# Altium footprint library Connectors.PcbLib: 74 footprints (part 1 of 5)
Each footprint in its own frame and in the unit in brackets; x right, y up, seen from the top. Pads: shape width x height; smd on the part's side, far side on the other; paste and mask are expansions set on the pad; w line width, h text height; cw(c..) or ccw(c..) is an arc to the next point about the centre after c.
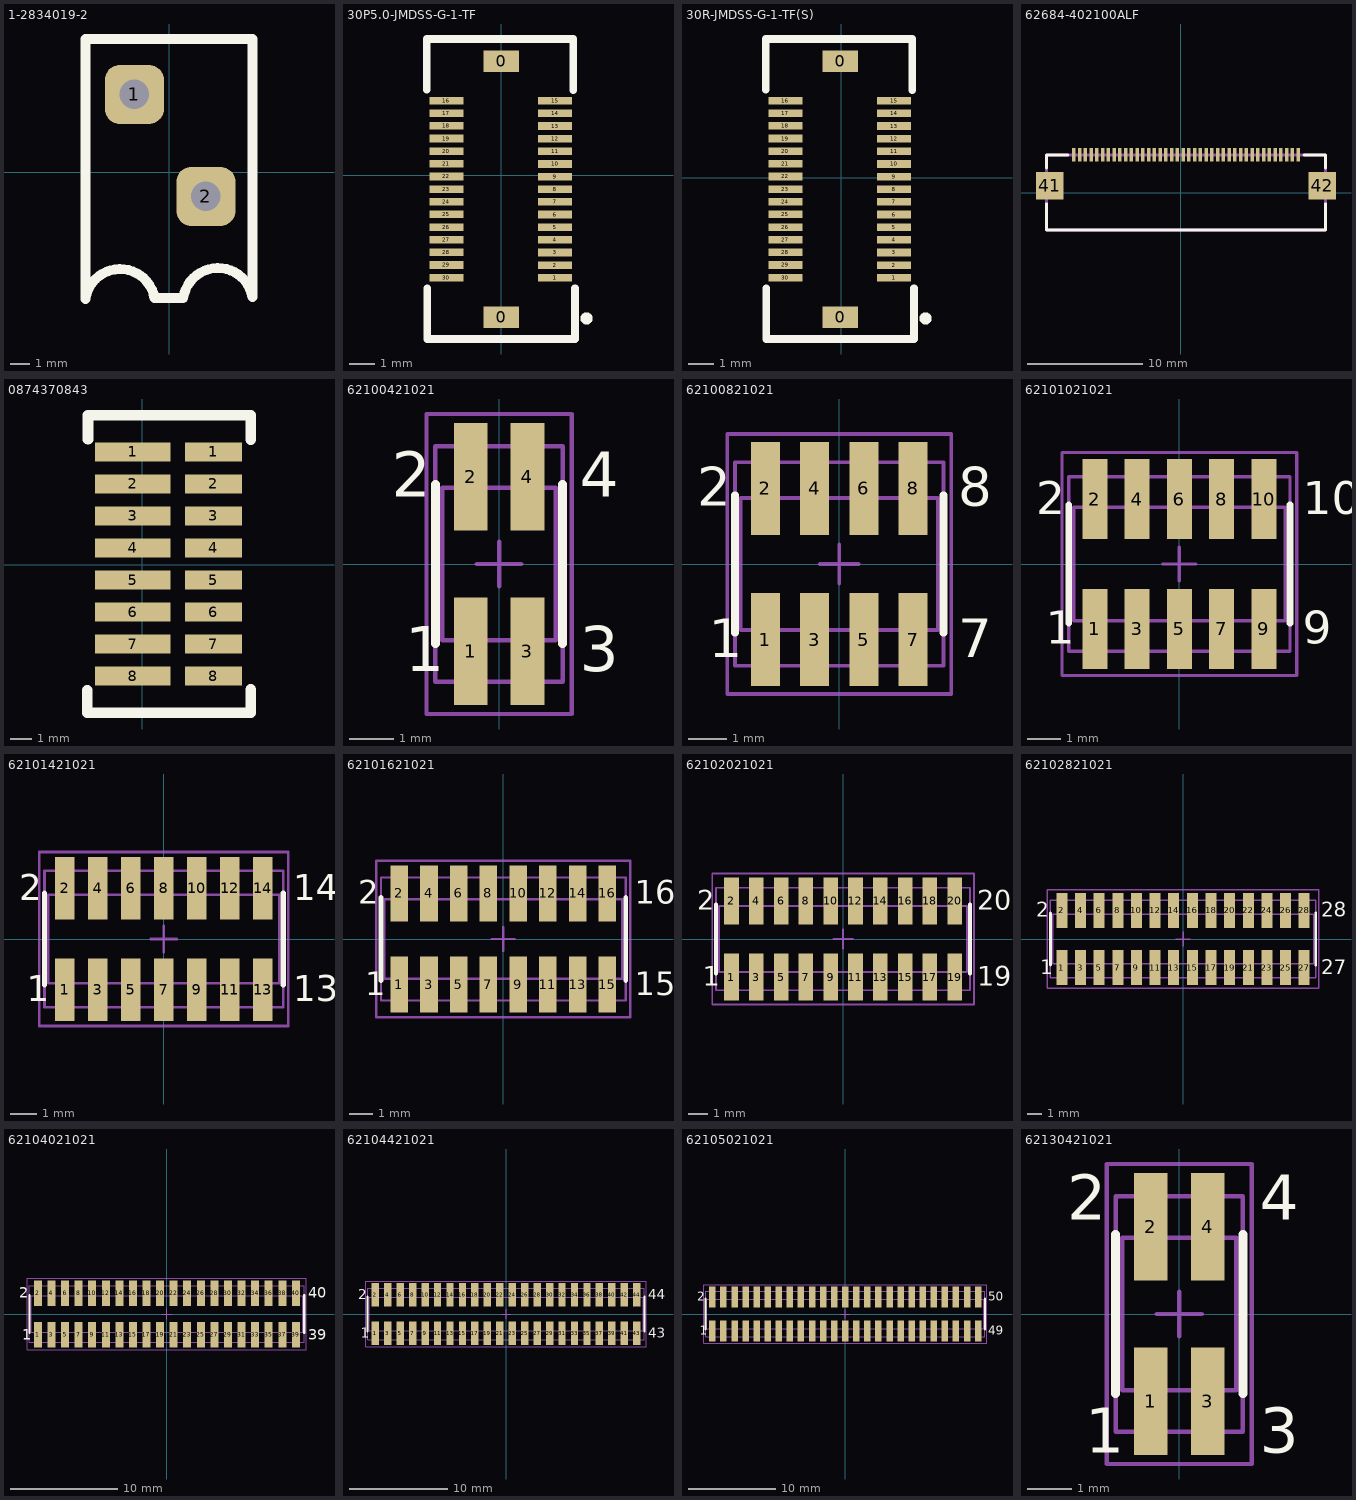
[diagram p0: the footprints below, top view; thin cyan lines are the x and y axes]

## 1-2834019-2 [mm]
pads (2):
  rrect50% 3x3 hole 1.5: 1(-1.778,3.962) 2(1.854,-1.219)
Top Overlay:
  lines w0.5: -4.267,-6.426 cw(c-2.508,-6.686) -0.757,-6.379 0.706,-6.379 ; -4.267,-6.299 -4.267,6.782 4.216,6.782 4.216,-6.299 ; 0.706,-6.372 cw(c2.465,-6.631) 4.216,-6.325
3D body "c-1-2834019-2-1-3d.stp": height 6.5, standoff -3.5, extent -3.962,-5.996 3.938,6.504

## 30P5.0-JMDSS-G-1-TF [mm]
pads (32):
  rect 1.4x0.85 smd: 0(0,-5.613) 0(0,4.496)
  rect 1.35x0.3 smd: 1(2.134,-4.056) 2(2.134,-3.556) 3(2.134,-3.056) 4(2.134,-2.556) 5(2.134,-2.056) 6(2.134,-1.556) 7(2.134,-1.056) 8(2.134,-0.556) 9(2.134,-0.056) 10(2.134,0.444) 11(2.134,0.944) 12(2.134,1.444) 13(2.134,1.944) 14(2.134,2.444) 15(2.134,2.944) 16(-2.159,2.949) 17(-2.159,2.449) 18(-2.159,1.949) 19(-2.159,1.449) 20(-2.159,0.949) 21(-2.159,0.449) 22(-2.159,-0.051) 23(-2.159,-0.551) 24(-2.159,-1.051) 25(-2.159,-1.551) 26(-2.159,-2.051) 27(-2.159,-2.551) 28(-2.159,-3.051) 29(-2.159,-3.551) 30(-2.159,-4.051)
Top Overlay:
  circle w0.254: c3.378,-5.664 r0.114
  lines w0.3: -2.946,3.378 -2.946,5.385 2.845,5.385 2.845,3.353 ; -2.921,-4.47 -2.921,-6.477 2.921,-6.477 2.921,-4.47
3D body "30P5.0-JMDSS-G-1-TF.STEP": height 3.95, standoff 0.05, extent -2.718,-6.351 2.582,5.249

## 30R-JMDSS-G-1-TF(S) [mm] "JST Connector"
pads (32):
  rect 1.4x0.85 smd: 0(-0.049,-5.509) 0(-0.049,4.6)
  rect 1.35x0.3 smd: 1(2.085,-3.952) 2(2.085,-3.452) 3(2.085,-2.952) 4(2.085,-2.452) 5(2.085,-1.952) 6(2.085,-1.452) 7(2.085,-0.952) 8(2.085,-0.452) 9(2.085,0.048) 10(2.085,0.548) 11(2.085,1.048) 12(2.085,1.548) 13(2.085,2.048) 14(2.085,2.548) 15(2.085,3.048) 16(-2.208,3.053) 17(-2.208,2.553) 18(-2.208,2.053) 19(-2.208,1.553) 20(-2.208,1.053) 21(-2.208,0.553) 22(-2.208,0.053) 23(-2.208,-0.447) 24(-2.208,-0.947) 25(-2.208,-1.447) 26(-2.208,-1.947) 27(-2.208,-2.447) 28(-2.208,-2.947) 29(-2.208,-3.447) 30(-2.208,-3.947)
Top Overlay:
  circle w0.254: c3.329,-5.56 r0.114
  lines w0.3: -2.995,3.482 -2.995,5.489 2.796,5.489 2.796,3.457 ; -2.97,-4.366 -2.97,-6.373 2.872,-6.373 2.872,-4.366
3D body "30R-JMDSS-G-1-TF(S).STEP": height 3.05, standoff -0.05, extent -2.64,-6.229 2.36,5.371

## 62684-402100ALF [mm]
pads (42):
  rect 0.3x1.2 smd: 1(-9.292,3.293) 2(-8.792,3.293) 3(-8.292,3.293) 4(-7.792,3.293) 5(-7.292,3.293) 6(-6.792,3.293) 7(-6.292,3.293) 8(-5.792,3.293) 9(-5.292,3.293) 10(-4.792,3.293) 11(-4.292,3.293) 12(-3.792,3.293) 13(-3.292,3.293) 14(-2.792,3.293) 15(-2.292,3.293) 16(-1.792,3.293) 17(-1.292,3.293) 18(-0.792,3.293) 19(-0.292,3.293) 20(0.208,3.293) 21(0.708,3.293) 22(1.208,3.293) 23(1.708,3.293) 24(2.208,3.293) 25(2.708,3.293) 26(3.208,3.293) 27(3.708,3.293) 28(4.208,3.293) 29(4.708,3.293) 30(5.208,3.293) 31(5.708,3.293) 32(6.208,3.293) 33(6.708,3.293) 34(7.208,3.293) 35(7.708,3.293) 36(8.208,3.293) 37(8.708,3.293) 38(9.208,3.293) 39(9.708,3.293) 40(10.208,3.293)
  rect 2.4x2.4 smd: 41(-11.392,0.593) 42(12.308,0.593)
Top Overlay:
  lines w0.254: -11.692,-0.964 -11.692,-3.257 12.608,-3.257 12.608,-0.964 ; -11.692,2.148 -11.692,3.293 -9.798,3.293 ; 10.714,3.293 12.608,3.293 12.608,2.148
Mechanical 15:
  lines w0.254: -11.692,-3.257 12.608,-3.257 12.608,3.293 -11.692,3.293 -11.692,-3.257
3D body "s62684-402100alf.stp": height 2, standoff -0.05, extent -12.3,-2.2 13.2,3.4

## 0874370843 [mm]
pads (16):
  rect 3.55x0.9 smd: 1(-0.457,5.289) 2(-0.457,3.789) 3(-0.457,2.289) 4(-0.457,0.789) 5(-0.457,-0.711) 6(-0.457,-2.211) 7(-0.457,-3.711) 8(-0.457,-5.211)
  rect 2.65x0.9 smd: 1(3.327,5.289) 2(3.327,3.789) 3(3.327,2.289) 4(3.327,0.789) 5(3.327,-0.711) 6(3.327,-2.211) 7(3.327,-3.711) 8(3.327,-5.211)
Top Overlay:
  lines w0.5: -2.591,-5.88 -2.591,-6.934 5.08,-6.934 5.08,-5.842 ; -2.553,5.88 -2.553,7.01 5.08,7.01 5.08,5.867
3D body "874370843.stp": height 5.77, standoff 0.02, extent -1.514,-6.599 4.486,6.701

## 62100421021 [mm] "Pin Header, pitch 1.27 mm, SMD, Vertical, dual row, 4p"
height 6.55
pads (4):
  rect 0.75x2.4 smd: 1(-0.635,-1.95) 2(-0.635,1.95) 3(0.635,-1.95) 4(0.635,1.95)
Top Overlay:
  lines w0.2: -1.42,-1.775 -1.42,1.775 ; 1.42,-1.775 1.42,1.775
  text "1" at -2.1,-2.4 h1
  text "2" at -2.4,1.5 h1
  text "3" at 1.8,-2.4 h1
  text "4" at 1.8,1.5 h1
Mechanical 11:
  lines w0.1: -1.27,-1.7 -1.27,1.7 1.27,1.7 1.27,-1.7 -1.27,-1.7
Mechanical 13:
  lines w0.1: -1.42,-2.625 1.42,-2.625 1.42,2.625 -1.42,2.625 -1.42,-2.625
Mechanical 15:
  lines w0.1: -0.5,0 0.5,0 ; 0,-0.5 0,0.5 ; -1.62,-3.35 -1.62,3.35 1.62,3.35 1.62,-3.35 -1.62,-3.35
3D body "62100421021.stp": height 5.9, standoff 0, extent -1.27,-2.55 1.27,2.55

## 62100821021 [mm] "Pin Header, pitch 1.27 mm, SMD, Vertical, dual row, 8p"
height 6.55
pads (8):
  rect 0.75x2.4 smd: 1(-1.905,-1.95) 2(-1.905,1.95) 3(-0.635,-1.95) 4(-0.635,1.95) 5(0.635,-1.95) 6(0.635,1.95) 7(1.905,-1.95) 8(1.905,1.95)
Top Overlay:
  lines w0.2: -2.69,-1.775 -2.69,1.775 ; 2.69,-1.775 2.69,1.775
  text "8" at 3.07,1.5 h1
  text "7" at 3.07,-2.4 h1
  text "2" at -3.67,1.5 h1
  text "1" at -3.37,-2.4 h1
Mechanical 11:
  lines w0.1: -2.54,-1.7 2.54,-1.7 2.54,1.7 -2.54,1.7 -2.54,-1.7
Mechanical 13:
  lines w0.1: -2.69,-2.625 -2.69,2.625 2.69,2.625 2.69,-2.625 -2.69,-2.625
Mechanical 15:
  lines w0.1: -0.5,0 0.5,0 ; 0,-0.5 0,0.5 ; -2.89,-3.35 2.89,-3.35 2.89,3.35 -2.89,3.35 -2.89,-3.35
3D body "62100821021.stp": height 5.9, standoff -0.01, extent -2.54,-2.5 2.54,2.5

## 62101021021 [mm] "Pin Header, pitch 1.27 mm, SMD, Vertical, dual row, 10p"
height 6.55
pads (10):
  rect 0.75x2.4 smd: 1(-2.54,-1.95) 2(-2.54,1.95) 3(-1.27,-1.95) 4(-1.27,1.95) 5(0,-1.95) 6(0,1.95) 7(1.27,-1.95) 8(1.27,1.95) 9(2.54,-1.95) 10(2.54,1.95)
Top Overlay:
  lines w0.2: -3.325,-1.775 -3.325,1.775 ; 3.325,-1.775 3.325,1.775
  text "10" at 3.705,1.5 h1
  text "9" at 3.705,-2.4 h1
  text "1" at -4.005,-2.4 h1
  text "2" at -4.305,1.5 h1
Mechanical 11:
  lines w0.1: -3.175,-1.7 -3.175,1.7 3.175,1.7 3.175,-1.7 -3.175,-1.7
Mechanical 13:
  lines w0.1: -3.325,-2.625 3.325,-2.625 3.325,2.625 -3.325,2.625 -3.325,-2.625
Mechanical 15:
  lines w0.1: -0.5,0 0.5,0 ; 0,-0.5 0,0.5 ; -3.525,-3.35 -3.525,3.35 3.525,3.35 3.525,-3.35 -3.525,-3.35
3D body "62101021021.stp": height 5.9, standoff -0.01, extent -3.175,-2.5 3.175,2.5

## 62101421021 [mm] "Pin Header, pitch 1.27 mm, SMD, Vertical, dual row, 14p"
height 6.55
pads (14):
  rect 0.75x2.4 smd: 1(-3.81,-1.95) 2(-3.81,1.95) 3(-2.54,-1.95) 4(-2.54,1.95) 5(-1.27,-1.95) 6(-1.27,1.95) 7(0,-1.95) 8(0,1.95) 9(1.27,-1.95) 10(1.27,1.95) 11(2.54,-1.95) 12(2.54,1.95) 13(3.81,-1.95) 14(3.81,1.95)
Top Overlay:
  lines w0.2: -4.595,-1.775 -4.595,1.775 ; 4.595,-1.775 4.595,1.775
  text "14" at 4.975,1.5 h1
  text "13" at 4.975,-2.4 h1
  text "1" at -5.275,-2.4 h1
  text "2" at -5.575,1.5 h1
Mechanical 11:
  lines w0.1: -4.445,-1.7 -4.445,1.7 4.445,1.7 4.445,-1.7 -4.445,-1.7
Mechanical 13:
  lines w0.1: -4.595,-2.625 4.595,-2.625 4.595,2.625 -4.595,2.625 -4.595,-2.625
Mechanical 15:
  lines w0.1: -0.5,0 0.5,0 ; 0,-0.5 0,0.5 ; -4.795,-3.35 -4.795,3.35 4.795,3.35 4.795,-3.35 -4.795,-3.35
3D body "62101421021.stp": height 5.9, standoff -0.01, extent -4.445,-2.5 4.445,2.5

## 62101621021 [mm] "Pin Header, pitch 1.27 mm, SMD, Vertical, dual row, 16p"
height 6.55
pads (16):
  rect 0.75x2.4 smd: 1(-4.445,-1.95) 2(-4.445,1.95) 3(-3.175,-1.95) 4(-3.175,1.95) 5(-1.905,-1.95) 6(-1.905,1.95) 7(-0.635,-1.95) 8(-0.635,1.95) 9(0.635,-1.95) 10(0.635,1.95) 11(1.905,-1.95) 12(1.905,1.95) 13(3.175,-1.95) 14(3.175,1.95) 15(4.445,-1.95) 16(4.445,1.95)
Top Overlay:
  lines w0.2: -5.23,-1.775 -5.23,1.775 ; 5.23,-1.775 5.23,1.775
  text "16" at 5.61,1.5 h1
  text "15" at 5.61,-2.4 h1
  text "2" at -6.21,1.5 h1
  text "1" at -5.91,-2.4 h1
Mechanical 11:
  lines w0.1: -5.08,-1.7 5.08,-1.7 5.08,1.7 -5.08,1.7 -5.08,-1.7
Mechanical 13:
  lines w0.1: -5.23,-2.625 -5.23,2.625 5.23,2.625 5.23,-2.625 -5.23,-2.625
Mechanical 15:
  lines w0.1: -0.5,0 0.5,0 ; 0,-0.5 0,0.5 ; -5.43,-3.35 5.43,-3.35 5.43,3.35 -5.43,3.35 -5.43,-3.35
3D body "62101621021.stp": height 5.9, standoff -0.01, extent -5.08,-2.5 5.08,2.5

## 62102021021 [mm] "Pin Header, pitch 1.27 mm, SMD, Vertical, dual row, 20p"
height 6.55
pads (20):
  rect 0.75x2.4 smd: 1(-5.715,-1.95) 2(-5.715,1.95) 3(-4.445,-1.95) 4(-4.445,1.95) 5(-3.175,-1.95) 6(-3.175,1.95) 7(-1.905,-1.95) 8(-1.905,1.95) 9(-0.635,-1.95) 10(-0.635,1.95) 11(0.635,-1.95) 12(0.635,1.95) 13(1.905,-1.95) 14(1.905,1.95) 15(3.175,-1.95) 16(3.175,1.95) 17(4.445,-1.95) 18(4.445,1.95) 19(5.715,-1.95) 20(5.715,1.95)
Top Overlay:
  lines w0.2: -6.5,-1.775 -6.5,1.775 ; 6.5,-1.775 6.5,1.775
  text "20" at 6.88,1.5 h1
  text "19" at 6.88,-2.4 h1
  text "2" at -7.48,1.5 h1
  text "1" at -7.18,-2.4 h1
Mechanical 11:
  lines w0.1: -6.35,-1.7 6.35,-1.7 6.35,1.7 -6.35,1.7 -6.35,-1.7
Mechanical 13:
  lines w0.1: -6.5,-2.625 -6.5,2.625 6.5,2.625 6.5,-2.625 -6.5,-2.625
Mechanical 15:
  lines w0.1: -0.5,0 0.5,0 ; 0,-0.5 0,0.5 ; -6.7,-3.35 6.7,-3.35 6.7,3.35 -6.7,3.35 -6.7,-3.35
3D body "62102021021.stp": height 5.9, standoff -0.01, extent -6.35,-2.5 6.35,2.5

## 62102821021 [mm] "Pin Header, pitch 1.27 mm, SMD, Vertical, dual row, 28p"
height 6.55
pads (28):
  rect 0.75x2.4 smd: 1(-8.255,-1.95) 2(-8.255,1.95) 3(-6.985,-1.95) 4(-6.985,1.95) 5(-5.715,-1.95) 6(-5.715,1.95) 7(-4.445,-1.95) 8(-4.445,1.95) 9(-3.175,-1.95) 10(-3.175,1.95) 11(-1.905,-1.95) 12(-1.905,1.95) 13(-0.635,-1.95) 14(-0.635,1.95) 15(0.635,-1.95) 16(0.635,1.95) 17(1.905,-1.95) 18(1.905,1.95) 19(3.175,-1.95) 20(3.175,1.95) 21(4.445,-1.95) 22(4.445,1.95) 23(5.715,-1.95) 24(5.715,1.95) 25(6.985,-1.95) 26(6.985,1.95) 27(8.255,-1.95) 28(8.255,1.95)
Top Overlay:
  lines w0.2: -9.04,-1.775 -9.04,1.775 ; 9.04,-1.775 9.04,1.775
  text "28" at 9.42,1.5 h1
  text "27" at 9.42,-2.4 h1
  text "2" at -10.02,1.5 h1
  text "1" at -9.72,-2.4 h1
Mechanical 11:
  lines w0.1: -8.89,-1.7 8.89,-1.7 8.89,1.7 -8.89,1.7 -8.89,-1.7
Mechanical 13:
  lines w0.1: -9.04,-2.625 -9.04,2.625 9.04,2.625 9.04,-2.625 -9.04,-2.625
Mechanical 15:
  lines w0.1: -0.5,0 0.5,0 ; 0,-0.5 0,0.5 ; -9.24,-3.35 9.24,-3.35 9.24,3.35 -9.24,3.35 -9.24,-3.35
3D body "62102821021.stp": height 5.9, standoff -0.01, extent -8.89,-2.5 8.89,2.5

## 62104021021 [mm] "Pin Header, pitch 1.27 mm, SMD, Vertical, dual row, 40p"
height 6.55
pads (40):
  rect 0.75x2.4 smd: 1(-12.065,-1.95) 2(-12.065,1.95) 3(-10.795,-1.95) 4(-10.795,1.95) 5(-9.525,-1.95) 6(-9.525,1.95) 7(-8.255,-1.95) 8(-8.255,1.95) 9(-6.985,-1.95) 10(-6.985,1.95) 11(-5.715,-1.95) 12(-5.715,1.95) 13(-4.445,-1.95) 14(-4.445,1.95) 15(-3.175,-1.95) 16(-3.175,1.95) 17(-1.905,-1.95) 18(-1.905,1.95) 19(-0.635,-1.95) 20(-0.635,1.95) 21(0.635,-1.95) 22(0.635,1.95) 23(1.905,-1.95) 24(1.905,1.95) 25(3.175,-1.95) 26(3.175,1.95) 27(4.445,-1.95) 28(4.445,1.95) 29(5.715,-1.95) 30(5.715,1.95) 31(6.985,-1.95) 32(6.985,1.95) 33(8.255,-1.95) 34(8.255,1.95) 35(9.525,-1.95) 36(9.525,1.95) 37(10.795,-1.95) 38(10.795,1.95) 39(12.065,-1.95) 40(12.065,1.95)
Top Overlay:
  lines w0.2: -12.85,-1.775 -12.85,1.775 ; 12.85,-1.775 12.85,1.775
  text "1" at -13.53,-2.4 h1
  text "2" at -13.83,1.5 h1
  text "39" at 13.23,-2.4 h1
  text "40" at 13.23,1.5 h1
Mechanical 11:
  lines w0.1: -12.7,-1.7 -12.7,1.7 12.7,1.7 12.7,-1.7 -12.7,-1.7
Mechanical 13:
  lines w0.1: -12.85,-2.625 12.85,-2.625 12.85,2.625 -12.85,2.625 -12.85,-2.625
Mechanical 15:
  lines w0.1: -0.5,0 0.5,0 ; 0,-0.5 0,0.5 ; -13.05,-3.35 -13.05,3.35 13.05,3.35 13.05,-3.35 -13.05,-3.35
3D body "62104021021.stp": height 5.9, standoff -0.01, extent -12.7,-2.5 12.7,2.5

## 62104421021 [mm] "Pin Header, pitch 1.27 mm, SMD, Vertical, dual row, 44p"
height 6.55
pads (44):
  rect 0.75x2.4 smd: 1(-13.335,-1.95) 2(-13.335,1.95) 3(-12.065,-1.95) 4(-12.065,1.95) 5(-10.795,-1.95) 6(-10.795,1.95) 7(-9.525,-1.95) 8(-9.525,1.95) 9(-8.255,-1.95) 10(-8.255,1.95) 11(-6.985,-1.95) 12(-6.985,1.95) 13(-5.715,-1.95) 14(-5.715,1.95) 15(-4.445,-1.95) 16(-4.445,1.95) 17(-3.175,-1.95) 18(-3.175,1.95) 19(-1.905,-1.95) 20(-1.905,1.95) 21(-0.635,-1.95) 22(-0.635,1.95) 23(0.635,-1.95) 24(0.635,1.95) 25(1.905,-1.95) 26(1.905,1.95) 27(3.175,-1.95) 28(3.175,1.95) 29(4.445,-1.95) 30(4.445,1.95) 31(5.715,-1.95) 32(5.715,1.95) 33(6.985,-1.95) 34(6.985,1.95) 35(8.255,-1.95) 36(8.255,1.95) 37(9.525,-1.95) 38(9.525,1.95) 39(10.795,-1.95) 40(10.795,1.95) 41(12.065,-1.95) 42(12.065,1.95) 43(13.335,-1.95) 44(13.335,1.95)
Top Overlay:
  lines w0.2: -14.12,-1.775 -14.12,1.775 ; 14.12,-1.775 14.12,1.775
  text "2" at -15.1,1.5 h1
  text "1" at -14.8,-2.4 h1
  text "43" at 14.5,-2.4 h1
  text "44" at 14.5,1.5 h1
Mechanical 11:
  lines w0.1: -13.97,-1.7 13.97,-1.7 13.97,1.7 -13.97,1.7 -13.97,-1.7
Mechanical 13:
  lines w0.1: -14.12,-2.625 -14.12,2.625 14.12,2.625 14.12,-2.625 -14.12,-2.625
Mechanical 15:
  lines w0.1: -0.5,0 0.5,0 ; 0,-0.5 0,0.5 ; -14.32,-3.35 14.32,-3.35 14.32,3.35 -14.32,3.35 -14.32,-3.35
3D body "62104421021.stp": height 5.9, standoff -0.01, extent -13.97,-2.5 13.97,2.5

## 62105021021 [mm] "Pin Header, pitch 1.27 mm, SMD, Vertical, dual row, 50p"
height 6.55
pads (50):
  rect 0.75x2.4 smd: 1(-15.24,-1.95) 2(-15.24,1.95) 3(-13.97,-1.95) 4(-13.97,1.95) 5(-12.7,-1.95) 6(-12.7,1.95) 7(-11.43,-1.95) 8(-11.43,1.95) 9(-10.16,-1.95) 10(-10.16,1.95) 11(-8.89,-1.95) 12(-8.89,1.95) 13(-7.62,-1.95) 14(-7.62,1.95) 15(-6.35,-1.95) 16(-6.35,1.95) 17(-5.08,-1.95) 18(-5.08,1.95) 19(-3.81,-1.95) 20(-3.81,1.95) 21(-2.54,-1.95) 22(-2.54,1.95) 23(-1.27,-1.95) 24(-1.27,1.95) 25(0,-1.95) 26(0,1.95) 27(1.27,-1.95) 28(1.27,1.95) 29(2.54,-1.95) 30(2.54,1.95) 31(3.81,-1.95) 32(3.81,1.95) 33(5.08,-1.95) 34(5.08,1.95) 35(6.35,-1.95) 36(6.35,1.95) 37(7.62,-1.95) 38(7.62,1.95) 39(8.89,-1.95) 40(8.89,1.95) 41(10.16,-1.95) 42(10.16,1.95) 43(11.43,-1.95) 44(11.43,1.95) 45(12.7,-1.95) 46(12.7,1.95) 47(13.97,-1.95) 48(13.97,1.95) 49(15.24,-1.95) 50(15.24,1.95)
Top Overlay:
  lines w0.2: -16.025,-1.775 -16.025,1.775 ; 16.025,-1.775 16.025,1.775
  text "2" at -17.005,1.5 h1
  text "1" at -16.705,-2.4 h1
  text "49" at 16.405,-2.4 h1
  text "50" at 16.405,1.5 h1
Mechanical 11:
  lines w0.1: -15.875,-1.7 15.875,-1.7 15.875,1.7 -15.875,1.7 -15.875,-1.7
Mechanical 13:
  lines w0.1: -16.025,-2.625 -16.025,2.625 16.025,2.625 16.025,-2.625 -16.025,-2.625
Mechanical 15:
  lines w0.1: -0.5,0 0.5,0 ; 0,-0.5 0,0.5 ; -16.225,-3.35 16.225,-3.35 16.225,3.35 -16.225,3.35 -16.225,-3.35
3D body "62105021021.stp": height 5.9, standoff -0.01, extent -15.875,-2.5 15.875,2.5

## 62130421021 [mm] "Pin Header, pitch 1.27 mm, SMD, Vertical, dual row, 4p"
height 6.1
pads (4):
  rect 0.75x2.4 smd: 1(-0.635,-1.95) 2(-0.635,1.95) 3(0.635,-1.95) 4(0.635,1.95)
Top Overlay:
  lines w0.2: -1.42,-1.775 -1.42,1.775 ; 1.42,-1.775 1.42,1.775
  text "1" at -2.1,-3.1 h1
  text "3" at 1.8,-3.1 h1
  text "2" at -2.5,2.1 h1
  text "4" at 1.8,2.1 h1
Mechanical 11:
  lines w0.1: -1.27,-1.7 -1.27,1.7 1.27,1.7 1.27,-1.7 -1.27,-1.7
Mechanical 13:
  lines w0.1: -1.42,-2.625 1.42,-2.625 1.42,2.625 -1.42,2.625 -1.42,-2.625
Mechanical 15:
  lines w0.1: -0.5,0 0.5,0 ; 0,-0.5 0,0.5 ; -1.62,-3.35 1.62,-3.35 1.62,3.35 -1.62,3.35 -1.62,-3.35
3D body "62130421021.stp": height 5.9, standoff 0, extent -1.27,-2.55 1.27,2.55